# Altium schematic symbol library jlcpcb_2025_04_capacitors_extended_1206.schlib: 2503 symbols (part 10 of 14) (continued)
## GCJ31BR73A102KXJ1L
designator C?  Capacitance: 1nF  (hidden comment: *)
Capacitor, Ceramic (MLCC), 1nF, ±10%, 1kV, X7R, ±10%, SMD 1206; Manufacturer: Murata Electronics; Manufacturer Part Number: GCJ31BR73A102KXJ1L; Package Size: 1206; JLCPCB Basic Part: No; JLCPCB Part Number: C440144; Supplier 1: LCSC; Category: Capacitors - MLCC; Supplier Part Number 1: C440144; Tolerance: ±10%; Voltage Rating: 1kV; Temperature Coefficient: X7R; RoHS: Yes; ComponentLink1Description: Datasheet; ComponentLink1URL: https://wmsc.lcsc.com/wmsc/upload/file/pdf/v2/lcsc/2304140030_Murata-Electronics-GCJ31BR73A102KXJ1L_C440144.pdf; ComponentLink2Description: JLCPCB Part URL; ComponentLink2URL: https://jlcpcb.com/partdetail/C440144; ComponentLink3Description: LCSC Part URL; ComponentLink3URL: https://lcsc.com/product-detail/Multilayer-Ceramic-Capacitors-MLCC---SMD-SMT_Murata-Electronics-Murata-Electronics-GCJ31BR73A102KXJ1L_C440144.html
footprint CAP-1206 (1206 (3216M) Capacitor)
pins: 1, 2

## GCJ31BR73A332KXJ1L
designator C?  Capacitance: 3.3nF  (hidden comment: *)
Capacitor, Ceramic (MLCC), 3.3nF, ±10%, 1kV, X7R, ±10%, SMD 1206; Manufacturer: Murata Electronics; Manufacturer Part Number: GCJ31BR73A332KXJ1L; Package Size: 1206; JLCPCB Basic Part: No; JLCPCB Part Number: C2261389; Supplier 1: LCSC; Category: Capacitors - MLCC; Supplier Part Number 1: C2261389; Tolerance: ±10%; Voltage Rating: 1kV; Temperature Coefficient: X7R; RoHS: Yes; ComponentLink1Description: Datasheet; ComponentLink1URL: https://wmsc.lcsc.com/wmsc/upload/file/pdf/v2/lcsc/2308111556_Murata-Electronics-GCJ31BR73A332KXJ1L_C2261389.pdf; ComponentLink2Description: JLCPCB Part URL; ComponentLink2URL: https://jlcpcb.com/partdetail/C2261389; ComponentLink3Description: LCSC Part URL; ComponentLink3URL: https://lcsc.com/product-detail/Multilayer-Ceramic-Capacitors-MLCC---SMD-SMT_Murata-Electronics-Murata-Electronics-GCJ31BR73A332KXJ1L_C2261389.html
footprint CAP-1206 (1206 (3216M) Capacitor)
pins: 1, 2

## GCJ31BR73A472KXJ1L
designator C?  Capacitance: 4.7nF  (hidden comment: *)
Capacitor, Ceramic (MLCC), 4.7nF, ±10%, 1kV, X7R, ±10%, SMD 1206; Manufacturer: Murata Electronics; Manufacturer Part Number: GCJ31BR73A472KXJ1L; Package Size: 1206; JLCPCB Basic Part: No; JLCPCB Part Number: C437427; Supplier 1: LCSC; Category: Capacitors - MLCC; Supplier Part Number 1: C437427; Tolerance: ±10%; Voltage Rating: 1kV; Temperature Coefficient: X7R; RoHS: Yes; ComponentLink1Description: Datasheet; ComponentLink1URL: https://wmsc.lcsc.com/wmsc/upload/file/pdf/v2/lcsc/2304140030_Murata-Electronics-GCJ31BR73A472KXJ1L_C437427.pdf; ComponentLink2Description: JLCPCB Part URL; ComponentLink2URL: https://jlcpcb.com/partdetail/C437427; ComponentLink3Description: LCSC Part URL; ComponentLink3URL: https://lcsc.com/product-detail/Multilayer-Ceramic-Capacitors-MLCC---SMD-SMT_Murata-Electronics-Murata-Electronics-GCJ31BR73A472KXJ1L_C437427.html
footprint CAP-1206 (1206 (3216M) Capacitor)
pins: 1, 2

## GCJ31CC71E106KA15L
designator C?  Capacitance: 10uF  (hidden comment: *)
Capacitor, Ceramic (MLCC), 10uF, ±10%, 25V, X7S, ±10%, SMD 1206; Manufacturer: Murata Electronics; Manufacturer Part Number: GCJ31CC71E106KA15L; Package Size: 1206; JLCPCB Basic Part: No; JLCPCB Part Number: C710629; Supplier 1: LCSC; Category: Capacitors - MLCC; Supplier Part Number 1: C710629; Tolerance: ±10%; Voltage Rating: 25V; Temperature Coefficient: X7S; RoHS: Yes; ComponentLink1Description: Datasheet; ComponentLink1URL: https://wmsc.lcsc.com/wmsc/upload/file/pdf/v2/lcsc/2206281745_Murata-Electronics-GCJ31CC71E106KA15L_C710629.pdf; ComponentLink2Description: JLCPCB Part URL; ComponentLink2URL: https://jlcpcb.com/partdetail/C710629; ComponentLink3Description: LCSC Part URL; ComponentLink3URL: https://lcsc.com/product-detail/Multilayer-Ceramic-Capacitors-MLCC---SMD-SMT_Murata-Electronics-Murata-Electronics-GCJ31CC71E106KA15L_C710629.html
footprint CAP-1206 (1206 (3216M) Capacitor)
pins: 1, 2

## GCJ31CC71H475KA01L
designator C?  Capacitance: 4.7uF  (hidden comment: *)
Capacitor, Ceramic (MLCC), 4.7uF, ±10%, 50V, X7S, ±10%, SMD 1206; Manufacturer: Murata Electronics; Manufacturer Part Number: GCJ31CC71H475KA01L; Package Size: 1206; JLCPCB Basic Part: No; JLCPCB Part Number: C354363; Supplier 1: LCSC; Category: Capacitors - MLCC; Supplier Part Number 1: C354363; Tolerance: ±10%; Voltage Rating: 50V; Temperature Coefficient: X7S; RoHS: Yes; ComponentLink1Description: Datasheet; ComponentLink1URL: https://wmsc.lcsc.com/wmsc/upload/file/pdf/v2/lcsc/1912111437_Murata-Electronics-GCJ31CC71H475KA01L_C354363.pdf; ComponentLink2Description: JLCPCB Part URL; ComponentLink2URL: https://jlcpcb.com/partdetail/C354363; ComponentLink3Description: LCSC Part URL; ComponentLink3URL: https://lcsc.com/product-detail/Multilayer-Ceramic-Capacitors-MLCC---SMD-SMT_Murata-Electronics-Murata-Electronics-GCJ31CC71H475KA01L_C354363.html
footprint CAP-1206 (1206 (3216M) Capacitor)
pins: 1, 2

## GCJ31CC72A225KE01L
designator C?  Capacitance: 2.2uF  (hidden comment: *)
Capacitor, Ceramic (MLCC), 2.2uF, ±10%, 100V, ±10%, SMD 1206; Manufacturer: Murata Electronics; Manufacturer Part Number: GCJ31CC72A225KE01L; Package Size: 1206; JLCPCB Basic Part: No; JLCPCB Part Number: C782034; Supplier 1: LCSC; Category: Capacitors - MLCC; Supplier Part Number 1: C782034; Tolerance: ±10%; Voltage Rating: 100V; RoHS: Yes; ComponentLink1Description: Datasheet; ComponentLink1URL: https://wmsc.lcsc.com/wmsc/upload/file/pdf/v2/lcsc/2009121209_Murata-Electronics-GCJ31CC72A225KE01L_C782034.pdf; ComponentLink2Description: JLCPCB Part URL; ComponentLink2URL: https://jlcpcb.com/partdetail/C782034; ComponentLink3Description: LCSC Part URL; ComponentLink3URL: https://lcsc.com/product-detail/Multilayer-Ceramic-Capacitors-MLCC---SMD-SMT_Murata-Electronics-Murata-Electronics-GCJ31CC72A225KE01L_C782034.html
footprint CAP-1206 (1206 (3216M) Capacitor)
pins: 1, 2

## GCJ31CL8EL105KA07L
designator C?  Capacitance: 1uF  (hidden comment: *)
Capacitor, Ceramic (MLCC), 1uF, ±10%, 100V, ±10%, SMD 1206; Manufacturer: Murata Electronics; Manufacturer Part Number: GCJ31CL8EL105KA07L; Package Size: 1206; JLCPCB Basic Part: No; JLCPCB Part Number: C710631; Supplier 1: LCSC; Category: Capacitors - MLCC; Supplier Part Number 1: C710631; Tolerance: ±10%; Voltage Rating: 100V; RoHS: Yes; ComponentLink1Description: Datasheet; ComponentLink1URL: https://wmsc.lcsc.com/wmsc/upload/file/pdf/v2/lcsc/2101081033_Murata-Electronics-GCJ31CL8EL105KA07L_C710631.pdf; ComponentLink2Description: JLCPCB Part URL; ComponentLink2URL: https://jlcpcb.com/partdetail/C710631; ComponentLink3Description: LCSC Part URL; ComponentLink3URL: https://lcsc.com/product-detail/Multilayer-Ceramic-Capacitors-MLCC---SMD-SMT_Murata-Electronics-Murata-Electronics-GCJ31CL8EL105KA07L_C710631.html
footprint CAP-1206 (1206 (3216M) Capacitor)
pins: 1, 2

## GCJ31CR71C106KA15L
designator C?  Capacitance: 10uF  (hidden comment: *)
Capacitor, Ceramic (MLCC), 10uF, ±10%, 16V, ±10%, SMD 1206; Manufacturer: Murata Electronics; Manufacturer Part Number: GCJ31CR71C106KA15L; Package Size: 1206; JLCPCB Basic Part: No; JLCPCB Part Number: C710632; Supplier 1: LCSC; Category: Capacitors - MLCC; Supplier Part Number 1: C710632; Tolerance: ±10%; Voltage Rating: 16V; RoHS: Yes; ComponentLink1Description: Datasheet; ComponentLink1URL: https://wmsc.lcsc.com/wmsc/upload/file/pdf/v2/lcsc/2009141234_Murata-Electronics-GCJ31CR71C106KA15L_C710632.pdf; ComponentLink2Description: JLCPCB Part URL; ComponentLink2URL: https://jlcpcb.com/partdetail/C710632; ComponentLink3Description: LCSC Part URL; ComponentLink3URL: https://lcsc.com/product-detail/Multilayer-Ceramic-Capacitors-MLCC---SMD-SMT_Murata-Electronics-Murata-Electronics-GCJ31CR71C106KA15L_C710632.html
footprint CAP-1206 (1206 (3216M) Capacitor)
pins: 1, 2

## GCJ31CR71E475KA12L
designator C?  Capacitance: 4.7uF  (hidden comment: *)
Capacitor, Ceramic (MLCC), 4.7uF, ±10%, 25V, X7R, ±10%, SMD 1206; Manufacturer: Murata Electronics; Manufacturer Part Number: GCJ31CR71E475KA12L; Package Size: 1206; JLCPCB Basic Part: No; JLCPCB Part Number: C161121; Supplier 1: LCSC; Category: Capacitors - MLCC; Supplier Part Number 1: C161121; Tolerance: ±10%; Voltage Rating: 25V; Temperature Coefficient: X7R; RoHS: Yes; ComponentLink1Description: Datasheet; ComponentLink1URL: https://wmsc.lcsc.com/wmsc/upload/file/pdf/v2/lcsc/1912111437_Murata-Electronics-GCJ31CR71E475KA12L_C161121.pdf; ComponentLink2Description: JLCPCB Part URL; ComponentLink2URL: https://jlcpcb.com/partdetail/C161121; ComponentLink3Description: LCSC Part URL; ComponentLink3URL: https://lcsc.com/product-detail/Multilayer-Ceramic-Capacitors-MLCC---SMD-SMT_Murata-Electronics-Murata-Electronics-GCJ31CR71E475KA12L_C161121.html
footprint CAP-1206 (1206 (3216M) Capacitor)
pins: 1, 2

## GCJ31CR71H105KA12L
designator C?  Capacitance: 1uF  (hidden comment: *)
Capacitor, Ceramic (MLCC), 1uF, ±10%, 50V, X7R, ±10%, SMD 1206; Manufacturer: Murata Electronics; Manufacturer Part Number: GCJ31CR71H105KA12L; Package Size: 1206; JLCPCB Basic Part: No; JLCPCB Part Number: C161122; Supplier 1: LCSC; Category: Capacitors - MLCC; Supplier Part Number 1: C161122; Tolerance: ±10%; Voltage Rating: 50V; Temperature Coefficient: X7R; RoHS: Yes; ComponentLink1Description: Datasheet; ComponentLink1URL: https://wmsc.lcsc.com/wmsc/upload/file/pdf/v2/lcsc/1810201311_Murata-Electronics-GCJ31CR71H105KA12L_C161122.pdf; ComponentLink2Description: JLCPCB Part URL; ComponentLink2URL: https://jlcpcb.com/partdetail/C161122; ComponentLink3Description: LCSC Part URL; ComponentLink3URL: https://lcsc.com/product-detail/Multilayer-Ceramic-Capacitors-MLCC---SMD-SMT_Murata-Electronics-Murata-Electronics-GCJ31CR71H105KA12L_C161122.html
footprint CAP-1206 (1206 (3216M) Capacitor)
pins: 1, 2

## GCJ31CR71H225KA12K
designator C?  Capacitance: 2.2uF  (hidden comment: *)
Capacitor, Ceramic (MLCC), 2.2uF, ±10%, 50V, X7R, ±10%, SMD 1206; Manufacturer: Murata Electronics; Manufacturer Part Number: GCJ31CR71H225KA12K; Package Size: 1206; JLCPCB Basic Part: No; JLCPCB Part Number: C1864444; Supplier 1: LCSC; Category: Capacitors - MLCC; Supplier Part Number 1: C1864444; Tolerance: ±10%; Voltage Rating: 50V; Temperature Coefficient: X7R; RoHS: Yes; ComponentLink1Description: Datasheet; ComponentLink1URL: https://wmsc.lcsc.com/wmsc/upload/file/pdf/v2/lcsc/2201271800_Murata-Electronics-GCJ31CR71H225KA12K_C1864444.pdf; ComponentLink2Description: JLCPCB Part URL; ComponentLink2URL: https://jlcpcb.com/partdetail/C1864444; ComponentLink3Description: LCSC Part URL; ComponentLink3URL: https://lcsc.com/product-detail/Multilayer-Ceramic-Capacitors-MLCC---SMD-SMT_Murata-Electronics-Murata-Electronics-GCJ31CR71H225KA12K_C1864444.html
footprint CAP-1206 (1206 (3216M) Capacitor)
pins: 1, 2

## GCJ31CR71H225KA12L
designator C?  Capacitance: 2.2uF  (hidden comment: *)
Capacitor, Ceramic (MLCC), 2.2uF, ±10%, 50V, X7R, ±10%, SMD 1206; Manufacturer: Murata Electronics; Manufacturer Part Number: GCJ31CR71H225KA12L; Package Size: 1206; JLCPCB Basic Part: No; JLCPCB Part Number: C90787; Supplier 1: LCSC; Category: Capacitors - MLCC; Supplier Part Number 1: C90787; Tolerance: ±10%; Voltage Rating: 50V; Temperature Coefficient: X7R; RoHS: Yes; ComponentLink1Description: Datasheet; ComponentLink1URL: https://wmsc.lcsc.com/wmsc/upload/file/pdf/v2/lcsc/1810201312_Murata-Electronics-GCJ31CR71H225KA12L_C90787.pdf; ComponentLink2Description: JLCPCB Part URL; ComponentLink2URL: https://jlcpcb.com/partdetail/C90787; ComponentLink3Description: LCSC Part URL; ComponentLink3URL: https://lcsc.com/product-detail/Multilayer-Ceramic-Capacitors-MLCC---SMD-SMT_Murata-Electronics-Murata-Electronics-GCJ31CR71H225KA12L_C90787.html
footprint CAP-1206 (1206 (3216M) Capacitor)
pins: 1, 2

## GCJ31CR72A105KA01L
designator C?  Capacitance: 1uF  (hidden comment: *)
Capacitor, Ceramic (MLCC), 1uF, ±10%, 100V, X7R, ±10%, SMD 1206; Manufacturer: Murata Electronics; Manufacturer Part Number: GCJ31CR72A105KA01L; Package Size: 1206; JLCPCB Basic Part: No; JLCPCB Part Number: C354362; Supplier 1: LCSC; Category: Capacitors - MLCC; Supplier Part Number 1: C354362; Tolerance: ±10%; Voltage Rating: 100V; Temperature Coefficient: X7R; RoHS: Yes; ComponentLink1Description: Datasheet; ComponentLink1URL: https://wmsc.lcsc.com/wmsc/upload/file/pdf/v2/lcsc/1912111437_Murata-Electronics-GCJ31CR72A105KA01L_C354362.pdf; ComponentLink2Description: JLCPCB Part URL; ComponentLink2URL: https://jlcpcb.com/partdetail/C354362; ComponentLink3Description: LCSC Part URL; ComponentLink3URL: https://lcsc.com/product-detail/Multilayer-Ceramic-Capacitors-MLCC---SMD-SMT_Murata-Electronics-Murata-Electronics-GCJ31CR72A105KA01L_C354362.html
footprint CAP-1206 (1206 (3216M) Capacitor)
pins: 1, 2

## GCJ31CR72E104KXJ3L
designator C?  Capacitance: 100nF  (hidden comment: *)
Capacitor, Ceramic (MLCC), 100nF, ±10%, 250V, X7R, ±10%, SMD 1206; Manufacturer: Murata Electronics; Manufacturer Part Number: GCJ31CR72E104KXJ3L; Package Size: 1206; JLCPCB Basic Part: No; JLCPCB Part Number: C426652; Supplier 1: LCSC; Category: Capacitors - MLCC; Supplier Part Number 1: C426652; Tolerance: ±10%; Voltage Rating: 250V; Temperature Coefficient: X7R; RoHS: Yes; ComponentLink1Description: Datasheet; ComponentLink1URL: https://wmsc.lcsc.com/wmsc/upload/file/pdf/v2/lcsc/2304140030_Murata-Electronics-GCJ31CR72E104KXJ3L_C426652.pdf; ComponentLink2Description: JLCPCB Part URL; ComponentLink2URL: https://jlcpcb.com/partdetail/C426652; ComponentLink3Description: LCSC Part URL; ComponentLink3URL: https://lcsc.com/product-detail/Multilayer-Ceramic-Capacitors-MLCC---SMD-SMT_Murata-Electronics-Murata-Electronics-GCJ31CR72E104KXJ3L_C426652.html
footprint CAP-1206 (1206 (3216M) Capacitor)
pins: 1, 2

## GCJ31CR72J223KXJ3L
designator C?  Capacitance: 22nF  (hidden comment: *)
Capacitor, Ceramic (MLCC), 22nF, ±10%, 630V, X7R, ±10%, SMD 1206; Manufacturer: Murata Electronics; Manufacturer Part Number: GCJ31CR72J223KXJ3L; Package Size: 1206; JLCPCB Basic Part: No; JLCPCB Part Number: C437429; Supplier 1: LCSC; Category: Capacitors - MLCC; Supplier Part Number 1: C437429; Tolerance: ±10%; Voltage Rating: 630V; Temperature Coefficient: X7R; RoHS: Yes; ComponentLink1Description: Datasheet; ComponentLink1URL: https://wmsc.lcsc.com/wmsc/upload/file/pdf/v2/lcsc/2009141233_Murata-Electronics-GCJ31CR72J223KXJ3L_C437429.pdf; ComponentLink2Description: JLCPCB Part URL; ComponentLink2URL: https://jlcpcb.com/partdetail/C437429; ComponentLink3Description: LCSC Part URL; ComponentLink3URL: https://lcsc.com/product-detail/Multilayer-Ceramic-Capacitors-MLCC---SMD-SMT_Murata-Electronics-Murata-Electronics-GCJ31CR72J223KXJ3L_C437429.html
footprint CAP-1206 (1206 (3216M) Capacitor)
pins: 1, 2

## GCJ31CR73A103KXJ3L
designator C?  Capacitance: 10nF  (hidden comment: *)
Capacitor, Ceramic (MLCC), 10nF, ±10%, 1kV, X7R, ±10%, SMD 1206; Manufacturer: Murata Electronics; Manufacturer Part Number: GCJ31CR73A103KXJ3L; Package Size: 1206; JLCPCB Basic Part: No; JLCPCB Part Number: C524549; Supplier 1: LCSC; Category: Capacitors - MLCC; Supplier Part Number 1: C524549; Tolerance: ±10%; Voltage Rating: 1kV; Temperature Coefficient: X7R; RoHS: Yes; ComponentLink1Description: Datasheet; ComponentLink1URL: https://wmsc.lcsc.com/wmsc/upload/file/pdf/v2/lcsc/2005150732_Murata-Electronics-GCJ31CR73A103KXJ3L_C524549.pdf; ComponentLink2Description: JLCPCB Part URL; ComponentLink2URL: https://jlcpcb.com/partdetail/C524549; ComponentLink3Description: LCSC Part URL; ComponentLink3URL: https://lcsc.com/product-detail/Multilayer-Ceramic-Capacitors-MLCC---SMD-SMT_Murata-Electronics-Murata-Electronics-GCJ31CR73A103KXJ3L_C524549.html
footprint CAP-1206 (1206 (3216M) Capacitor)
pins: 1, 2

## GCJ31MR71E225KA12L
designator C?  Capacitance: 2.2uF  (hidden comment: *)
Capacitor, Ceramic (MLCC), 2.2uF, ±10%, 25V, X7R, ±10%, SMD 1206; Manufacturer: Murata Electronics; Manufacturer Part Number: GCJ31MR71E225KA12L; Package Size: 1206; JLCPCB Basic Part: No; JLCPCB Part Number: C782035; Supplier 1: LCSC; Category: Capacitors - MLCC; Supplier Part Number 1: C782035; Tolerance: ±10%; Voltage Rating: 25V; Temperature Coefficient: X7R; RoHS: Yes; ComponentLink1Description: Datasheet; ComponentLink1URL: https://wmsc.lcsc.com/wmsc/upload/file/pdf/v2/lcsc/2009121209_Murata-Electronics-GCJ31MR71E225KA12L_C782035.pdf; ComponentLink2Description: JLCPCB Part URL; ComponentLink2URL: https://jlcpcb.com/partdetail/C782035; ComponentLink3Description: LCSC Part URL; ComponentLink3URL: https://lcsc.com/product-detail/Multilayer-Ceramic-Capacitors-MLCC---SMD-SMT_Murata-Electronics-Murata-Electronics-GCJ31MR71E225KA12L_C782035.html
footprint CAP-1206 (1206 (3216M) Capacitor)
pins: 1, 2

## GCJ31MR71H105KA12L
designator C?  Capacitance: 1uF  (hidden comment: *)
Capacitor, Ceramic (MLCC), 1uF, ±10%, 50V, X7R, ±10%, SMD 1206; Manufacturer: Murata Electronics; Manufacturer Part Number: GCJ31MR71H105KA12L; Package Size: 1206; JLCPCB Basic Part: No; JLCPCB Part Number: C354361; Supplier 1: LCSC; Category: Capacitors - MLCC; Supplier Part Number 1: C354361; Tolerance: ±10%; Voltage Rating: 50V; Temperature Coefficient: X7R; RoHS: Yes; ComponentLink1Description: Datasheet; ComponentLink1URL: https://wmsc.lcsc.com/wmsc/upload/file/pdf/v2/lcsc/1912111437_Murata-Electronics-GCJ31MR71H105KA12L_C354361.pdf; ComponentLink2Description: JLCPCB Part URL; ComponentLink2URL: https://jlcpcb.com/partdetail/C354361; ComponentLink3Description: LCSC Part URL; ComponentLink3URL: https://lcsc.com/product-detail/Multilayer-Ceramic-Capacitors-MLCC---SMD-SMT_Murata-Electronics-Murata-Electronics-GCJ31MR71H105KA12L_C354361.html
footprint CAP-1206 (1206 (3216M) Capacitor)
pins: 1, 2

## GCJ31MR72A224KA01L
designator C?  Capacitance: 220nF  (hidden comment: *)
Capacitor, Ceramic (MLCC), 220nF, ±10%, 100V, X7R, ±10%, SMD 1206; Manufacturer: Murata Electronics; Manufacturer Part Number: GCJ31MR72A224KA01L; Package Size: 1206; JLCPCB Basic Part: No; JLCPCB Part Number: C363946; Supplier 1: LCSC; Category: Capacitors - MLCC; Supplier Part Number 1: C363946; Tolerance: ±10%; Voltage Rating: 100V; Temperature Coefficient: X7R; RoHS: Yes; ComponentLink1Description: Datasheet; ComponentLink1URL: https://wmsc.lcsc.com/wmsc/upload/file/pdf/v2/lcsc/2304140030_Murata-Electronics-GCJ31MR72A224KA01L_C363946.pdf; ComponentLink2Description: JLCPCB Part URL; ComponentLink2URL: https://jlcpcb.com/partdetail/C363946; ComponentLink3Description: LCSC Part URL; ComponentLink3URL: https://lcsc.com/product-detail/Multilayer-Ceramic-Capacitors-MLCC---SMD-SMT_Murata-Electronics-Murata-Electronics-GCJ31MR72A224KA01L_C363946.html
footprint CAP-1206 (1206 (3216M) Capacitor)
pins: 1, 2

## GCJ319R71H104KA01L
designator C?  Capacitance: 100nF  (hidden comment: *)
Capacitor, Ceramic (MLCC), 100nF, ±10%, 50V, X7R, ±10%, SMD 1206; Manufacturer: Murata Electronics; Manufacturer Part Number: GCJ319R71H104KA01L; Package Size: 1206; JLCPCB Basic Part: No; JLCPCB Part Number: C354364; Supplier 1: LCSC; Category: Capacitors - MLCC; Supplier Part Number 1: C354364; Tolerance: ±10%; Voltage Rating: 50V; Temperature Coefficient: X7R; RoHS: Yes; ComponentLink1Description: Datasheet; ComponentLink1URL: https://wmsc.lcsc.com/wmsc/upload/file/pdf/v2/lcsc/1912111437_Murata-Electronics-GCJ319R71H104KA01L_C354364.pdf; ComponentLink2Description: JLCPCB Part URL; ComponentLink2URL: https://jlcpcb.com/partdetail/C354364; ComponentLink3Description: LCSC Part URL; ComponentLink3URL: https://lcsc.com/product-detail/Multilayer-Ceramic-Capacitors-MLCC---SMD-SMT_Murata-Electronics-Murata-Electronics-GCJ319R71H104KA01L_C354364.html
footprint CAP-1206 (1206 (3216M) Capacitor)
pins: 1, 2

## GCJ319R72A104KA01L
designator C?  Capacitance: 100nF  (hidden comment: *)
Capacitor, Ceramic (MLCC), 100nF, ±10%, ±10%, SMD 1206; Manufacturer: Murata Electronics; Manufacturer Part Number: GCJ319R72A104KA01L; Package Size: 1206; JLCPCB Basic Part: No; JLCPCB Part Number: C527589; Supplier 1: LCSC; Category: Capacitors - MLCC; Supplier Part Number 1: C527589; Tolerance: ±10%; RoHS: Yes; ComponentLink1Description: Datasheet; ComponentLink1URL: https://wmsc.lcsc.com/wmsc/upload/file/pdf/v2/lcsc/2010141708_Murata-Electronics-GCJ319R72A104KA01L_C527589.pdf; ComponentLink2Description: JLCPCB Part URL; ComponentLink2URL: https://jlcpcb.com/partdetail/C527589; ComponentLink3Description: LCSC Part URL; ComponentLink3URL: https://lcsc.com/product-detail/Multilayer-Ceramic-Capacitors-MLCC---SMD-SMT_Murata-Electronics-Murata-Electronics-GCJ319R72A104KA01L_C527589.html
footprint CAP-1206 (1206 (3216M) Capacitor)
pins: 1, 2

## GCM31A5C2J151JX01D
designator C?  Capacitance: 150pF  (hidden comment: *)
Capacitor, Ceramic (MLCC), 150pF, ±5%, 630V, C0G, ±5%, SMD 1206; Manufacturer: Murata Electronics; Manufacturer Part Number: GCM31A5C2J151JX01D; Package Size: 1206; JLCPCB Basic Part: No; JLCPCB Part Number: C363947; Supplier 1: LCSC; Category: Capacitors - MLCC; Supplier Part Number 1: C363947; Tolerance: ±5%; Voltage Rating: 630V; Temperature Coefficient: C0G; RoHS: Yes; ComponentLink1Description: Datasheet; ComponentLink1URL: https://wmsc.lcsc.com/wmsc/upload/file/pdf/v2/lcsc/2304140030_Murata-Electronics-GCM31A5C2J151JX01D_C363947.pdf; ComponentLink2Description: JLCPCB Part URL; ComponentLink2URL: https://jlcpcb.com/partdetail/C363947; ComponentLink3Description: LCSC Part URL; ComponentLink3URL: https://lcsc.com/product-detail/Multilayer-Ceramic-Capacitors-MLCC---SMD-SMT_Murata-Electronics-Murata-Electronics-GCM31A5C2J151JX01D_C363947.html
footprint CAP-1206 (1206 (3216M) Capacitor)
pins: 1, 2

## GCM31A5C2J330JX01D
designator C?  Capacitance: 33pF  (hidden comment: *)
Capacitor, Ceramic (MLCC), 33pF, ±5%, 630V, C0G, ±5%, SMD 1206; Manufacturer: Murata Electronics; Manufacturer Part Number: GCM31A5C2J330JX01D; Package Size: 1206; JLCPCB Basic Part: No; JLCPCB Part Number: C2941952; Supplier 1: LCSC; Category: Capacitors - MLCC; Supplier Part Number 1: C2941952; Tolerance: ±5%; Voltage Rating: 630V; Temperature Coefficient: C0G; RoHS: Yes; ComponentLink1Description: Datasheet; ComponentLink1URL: https://wmsc.lcsc.com/wmsc/upload/file/pdf/v2/lcsc/2201121900_Murata-Electronics-GCM31A5C2J330JX01D_C2941952.pdf; ComponentLink2Description: JLCPCB Part URL; ComponentLink2URL: https://jlcpcb.com/partdetail/C2941952; ComponentLink3Description: LCSC Part URL; ComponentLink3URL: https://lcsc.com/product-detail/Multilayer-Ceramic-Capacitors-MLCC---SMD-SMT_Murata-Electronics-Murata-Electronics-GCM31A5C2J330JX01D_C2941952.html
footprint CAP-1206 (1206 (3216M) Capacitor)
pins: 1, 2

## GCM31A5C3A100JX01D
designator C?  Capacitance: 10pF  (hidden comment: *)
Capacitor, Ceramic (MLCC), 10pF, ±5%, 1kV, C0G, ±5%, SMD 1206; Manufacturer: Murata Electronics; Manufacturer Part Number: GCM31A5C3A100JX01D; Package Size: 1206; JLCPCB Basic Part: No; JLCPCB Part Number: C437499; Supplier 1: LCSC; Category: Capacitors - MLCC; Supplier Part Number 1: C437499; Tolerance: ±5%; Voltage Rating: 1kV; Temperature Coefficient: C0G; RoHS: Yes; ComponentLink1Description: Datasheet; ComponentLink1URL: https://wmsc.lcsc.com/wmsc/upload/file/pdf/v2/lcsc/2304140030_Murata-Electronics-GCM31A5C3A100JX01D_C437499.pdf; ComponentLink2Description: JLCPCB Part URL; ComponentLink2URL: https://jlcpcb.com/partdetail/C437499; ComponentLink3Description: LCSC Part URL; ComponentLink3URL: https://lcsc.com/product-detail/Multilayer-Ceramic-Capacitors-MLCC---SMD-SMT_Murata-Electronics-Murata-Electronics-GCM31A5C3A100JX01D_C437499.html
footprint CAP-1206 (1206 (3216M) Capacitor)
pins: 1, 2

## GCM31A5C3A101JX01D
designator C?  Capacitance: 100pF  (hidden comment: *)
Capacitor, Ceramic (MLCC), 100pF, ±5%, 1kV, C0G, ±5%, SMD 1206; Manufacturer: Murata Electronics; Manufacturer Part Number: GCM31A5C3A101JX01D; Package Size: 1206; JLCPCB Basic Part: No; JLCPCB Part Number: C363948; Supplier 1: LCSC; Category: Capacitors - MLCC; Supplier Part Number 1: C363948; Tolerance: ±5%; Voltage Rating: 1kV; Temperature Coefficient: C0G; RoHS: Yes; ComponentLink1Description: Datasheet; ComponentLink1URL: https://wmsc.lcsc.com/wmsc/upload/file/pdf/v2/lcsc/2304140030_Murata-Electronics-GCM31A5C3A101JX01D_C363948.pdf; ComponentLink2Description: JLCPCB Part URL; ComponentLink2URL: https://jlcpcb.com/partdetail/C363948; ComponentLink3Description: LCSC Part URL; ComponentLink3URL: https://lcsc.com/product-detail/Multilayer-Ceramic-Capacitors-MLCC---SMD-SMT_Murata-Electronics-Murata-Electronics-GCM31A5C3A101JX01D_C363948.html
footprint CAP-1206 (1206 (3216M) Capacitor)
pins: 1, 2

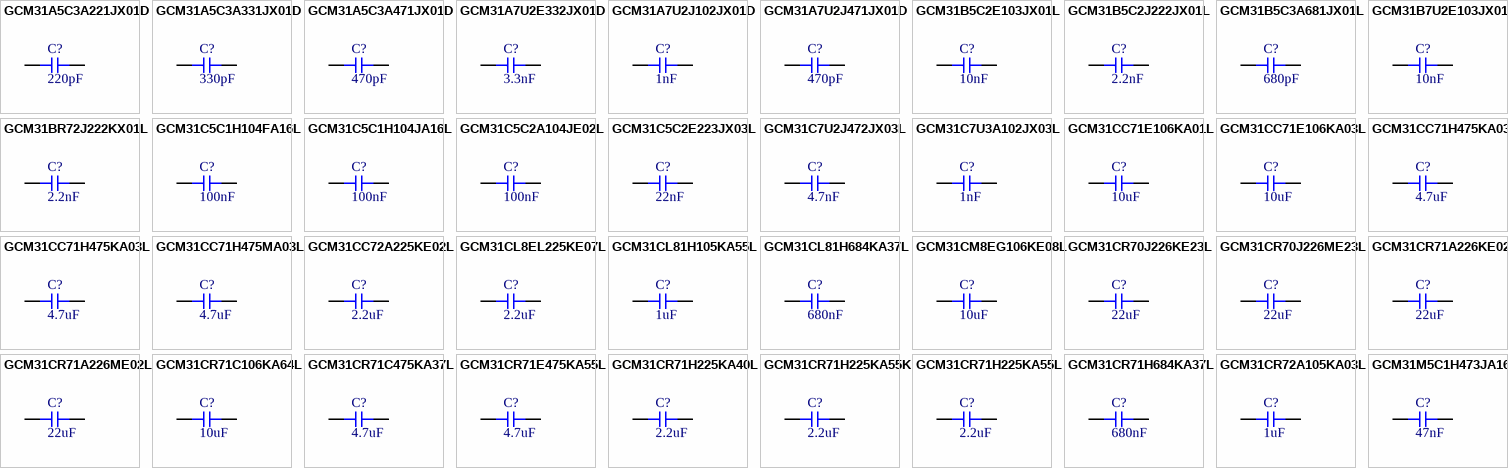
[diagram p44: symbols GCM31A5C3A221JX01D to GCM31M5C1H473JA16L]

## GCM31A5C3A221JX01D
designator C?  Capacitance: 220pF  (hidden comment: *)
Capacitor, Ceramic (MLCC), 220pF, ±5%, 1kV, ±5%, SMD 1206; Manufacturer: Murata Electronics; Manufacturer Part Number: GCM31A5C3A221JX01D; Package Size: 1206; JLCPCB Basic Part: No; JLCPCB Part Number: C909899; Supplier 1: LCSC; Category: Capacitors - MLCC; Supplier Part Number 1: C909899; Tolerance: ±5%; Voltage Rating: 1kV; RoHS: Yes; ComponentLink1Description: Datasheet; ComponentLink1URL: https://wmsc.lcsc.com/wmsc/upload/file/pdf/v2/lcsc/2201242100_Murata-Electronics-GCM31A5C3A221JX01D_C909899.pdf; ComponentLink2Description: JLCPCB Part URL; ComponentLink2URL: https://jlcpcb.com/partdetail/C909899; ComponentLink3Description: LCSC Part URL; ComponentLink3URL: https://lcsc.com/product-detail/Multilayer-Ceramic-Capacitors-MLCC---SMD-SMT_Murata-Electronics-Murata-Electronics-GCM31A5C3A221JX01D_C909899.html
footprint CAP-1206 (1206 (3216M) Capacitor)
pins: 1, 2

## GCM31A5C3A331JX01D
designator C?  Capacitance: 330pF  (hidden comment: *)
Capacitor, Ceramic (MLCC), 330pF, ±5%, 1kV, ±5%, SMD 1206; Manufacturer: Murata Electronics; Manufacturer Part Number: GCM31A5C3A331JX01D; Package Size: 1206; JLCPCB Basic Part: No; JLCPCB Part Number: C909898; Supplier 1: LCSC; Category: Capacitors - MLCC; Supplier Part Number 1: C909898; Tolerance: ±5%; Voltage Rating: 1kV; RoHS: Yes; ComponentLink1Description: Datasheet; ComponentLink1URL: https://wmsc.lcsc.com/wmsc/upload/file/pdf/v2/lcsc/2304140030_Murata-Electronics-GCM31A5C3A331JX01D_C909898.pdf; ComponentLink2Description: JLCPCB Part URL; ComponentLink2URL: https://jlcpcb.com/partdetail/C909898; ComponentLink3Description: LCSC Part URL; ComponentLink3URL: https://lcsc.com/product-detail/Multilayer-Ceramic-Capacitors-MLCC---SMD-SMT_Murata-Electronics-Murata-Electronics-GCM31A5C3A331JX01D_C909898.html
footprint CAP-1206 (1206 (3216M) Capacitor)
pins: 1, 2

## GCM31A5C3A471JX01D
designator C?  Capacitance: 470pF  (hidden comment: *)
Capacitor, Ceramic (MLCC), 470pF, ±5%, 1kV, ±5%, SMD 1206; Manufacturer: Murata Electronics; Manufacturer Part Number: GCM31A5C3A471JX01D; Package Size: 1206; JLCPCB Basic Part: No; JLCPCB Part Number: C909896; Supplier 1: LCSC; Category: Capacitors - MLCC; Supplier Part Number 1: C909896; Tolerance: ±5%; Voltage Rating: 1kV; RoHS: Yes; ComponentLink1Description: Datasheet; ComponentLink1URL: https://wmsc.lcsc.com/wmsc/upload/file/pdf/v2/lcsc/2304140030_Murata-Electronics-GCM31A5C3A471JX01D_C909896.pdf; ComponentLink2Description: JLCPCB Part URL; ComponentLink2URL: https://jlcpcb.com/partdetail/C909896; ComponentLink3Description: LCSC Part URL; ComponentLink3URL: https://lcsc.com/product-detail/Multilayer-Ceramic-Capacitors-MLCC---SMD-SMT_Murata-Electronics-Murata-Electronics-GCM31A5C3A471JX01D_C909896.html
footprint CAP-1206 (1206 (3216M) Capacitor)
pins: 1, 2

## GCM31A7U2E332JX01D
designator C?  Capacitance: 3.3nF  (hidden comment: *)
Capacitor, Ceramic (MLCC), 3.3nF, ±5%, 250V, U2J, ±5%, SMD 1206; Manufacturer: Murata Electronics; Manufacturer Part Number: GCM31A7U2E332JX01D; Package Size: 1206; JLCPCB Basic Part: No; JLCPCB Part Number: C909809; Supplier 1: LCSC; Category: Capacitors - MLCC; Supplier Part Number 1: C909809; Tolerance: ±5%; Voltage Rating: 250V; Temperature Coefficient: U2J; RoHS: Yes; ComponentLink1Description: Datasheet; ComponentLink1URL: https://wmsc.lcsc.com/wmsc/upload/file/pdf/v2/lcsc/2304140030_Murata-Electronics-GCM31A7U2E332JX01D_C909809.pdf; ComponentLink2Description: JLCPCB Part URL; ComponentLink2URL: https://jlcpcb.com/partdetail/C909809; ComponentLink3Description: LCSC Part URL; ComponentLink3URL: https://lcsc.com/product-detail/Multilayer-Ceramic-Capacitors-MLCC---SMD-SMT_Murata-Electronics-Murata-Electronics-GCM31A7U2E332JX01D_C909809.html
footprint CAP-1206 (1206 (3216M) Capacitor)
pins: 1, 2

## GCM31A7U2J102JX01D
designator C?  Capacitance: 1nF  (hidden comment: *)
Capacitor, Ceramic (MLCC), 1nF, ±5%, 630V, U2J, ±5%, SMD 1206; Manufacturer: Murata Electronics; Manufacturer Part Number: GCM31A7U2J102JX01D; Package Size: 1206; JLCPCB Basic Part: No; JLCPCB Part Number: C437500; Supplier 1: LCSC; Category: Capacitors - MLCC; Supplier Part Number 1: C437500; Tolerance: ±5%; Voltage Rating: 630V; Temperature Coefficient: U2J; RoHS: Yes; ComponentLink1Description: Datasheet; ComponentLink1URL: https://wmsc.lcsc.com/wmsc/upload/file/pdf/v2/lcsc/2304140030_Murata-Electronics-GCM31A7U2J102JX01D_C437500.pdf; ComponentLink2Description: JLCPCB Part URL; ComponentLink2URL: https://jlcpcb.com/partdetail/C437500; ComponentLink3Description: LCSC Part URL; ComponentLink3URL: https://lcsc.com/product-detail/Multilayer-Ceramic-Capacitors-MLCC---SMD-SMT_Murata-Electronics-Murata-Electronics-GCM31A7U2J102JX01D_C437500.html
footprint CAP-1206 (1206 (3216M) Capacitor)
pins: 1, 2

## GCM31A7U2J471JX01D
designator C?  Capacitance: 470pF  (hidden comment: *)
Capacitor, Ceramic (MLCC), 470pF, ±5%, 630V, U2J, ±5%, SMD 1206; Manufacturer: Murata Electronics; Manufacturer Part Number: GCM31A7U2J471JX01D; Package Size: 1206; JLCPCB Basic Part: No; JLCPCB Part Number: C393029; Supplier 1: LCSC; Category: Capacitors - MLCC; Supplier Part Number 1: C393029; Tolerance: ±5%; Voltage Rating: 630V; Temperature Coefficient: U2J; RoHS: Yes; ComponentLink1Description: Datasheet; ComponentLink1URL: https://wmsc.lcsc.com/wmsc/upload/file/pdf/v2/lcsc/2308111610_Murata-Electronics-GCM31A7U2J471JX01D_C393029.pdf; ComponentLink2Description: JLCPCB Part URL; ComponentLink2URL: https://jlcpcb.com/partdetail/C393029; ComponentLink3Description: LCSC Part URL; ComponentLink3URL: https://lcsc.com/product-detail/Multilayer-Ceramic-Capacitors-MLCC---SMD-SMT_Murata-Electronics-Murata-Electronics-GCM31A7U2J471JX01D_C393029.html
footprint CAP-1206 (1206 (3216M) Capacitor)
pins: 1, 2

## GCM31B5C2E103JX01L
designator C?  Capacitance: 10nF  (hidden comment: *)
Capacitor, Ceramic (MLCC), 10nF, ±5%, 250V, ±5%, SMD 1206; Manufacturer: Murata Electronics; Manufacturer Part Number: GCM31B5C2E103JX01L; Package Size: 1206; JLCPCB Basic Part: No; JLCPCB Part Number: C1021645; Supplier 1: LCSC; Category: Capacitors - MLCC; Supplier Part Number 1: C1021645; Tolerance: ±5%; Voltage Rating: 250V; RoHS: Yes; ComponentLink1Description: Datasheet; ComponentLink1URL: https://wmsc.lcsc.com/wmsc/upload/file/pdf/v2/lcsc/2304140030_Murata-Electronics-GCM31B5C2E103JX01L_C1021645.pdf; ComponentLink2Description: JLCPCB Part URL; ComponentLink2URL: https://jlcpcb.com/partdetail/C1021645; ComponentLink3Description: LCSC Part URL; ComponentLink3URL: https://lcsc.com/product-detail/Multilayer-Ceramic-Capacitors-MLCC---SMD-SMT_Murata-Electronics-Murata-Electronics-GCM31B5C2E103JX01L_C1021645.html
footprint CAP-1206 (1206 (3216M) Capacitor)
pins: 1, 2

## GCM31B5C2J222JX01L
designator C?  Capacitance: 2.2nF  (hidden comment: *)
Capacitor, Ceramic (MLCC), 2.2nF, ±5%, 630V, ±5%, SMD 1206; Manufacturer: Murata Electronics; Manufacturer Part Number: GCM31B5C2J222JX01L; Package Size: 1206; JLCPCB Basic Part: No; JLCPCB Part Number: C524557; Supplier 1: LCSC; Category: Capacitors - MLCC; Supplier Part Number 1: C524557; Tolerance: ±5%; Voltage Rating: 630V; RoHS: Yes; ComponentLink1Description: Datasheet; ComponentLink1URL: https://wmsc.lcsc.com/wmsc/upload/file/pdf/v2/lcsc/2304140030_Murata-Electronics-GCM31B5C2J222JX01L_C524557.pdf; ComponentLink2Description: JLCPCB Part URL; ComponentLink2URL: https://jlcpcb.com/partdetail/C524557; ComponentLink3Description: LCSC Part URL; ComponentLink3URL: https://lcsc.com/product-detail/Multilayer-Ceramic-Capacitors-MLCC---SMD-SMT_Murata-Electronics-Murata-Electronics-GCM31B5C2J222JX01L_C524557.html
footprint CAP-1206 (1206 (3216M) Capacitor)
pins: 1, 2

## GCM31B5C3A681JX01L
designator C?  Capacitance: 680pF  (hidden comment: *)
Capacitor, Ceramic (MLCC), 680pF, ±5%, 1kV, ±5%, SMD 1206; Manufacturer: Murata Electronics; Manufacturer Part Number: GCM31B5C3A681JX01L; Package Size: 1206; JLCPCB Basic Part: No; JLCPCB Part Number: C909894; Supplier 1: LCSC; Category: Capacitors - MLCC; Supplier Part Number 1: C909894; Tolerance: ±5%; Voltage Rating: 1kV; RoHS: Yes; ComponentLink1Description: Datasheet; ComponentLink1URL: https://wmsc.lcsc.com/wmsc/upload/file/pdf/v2/lcsc/2304140030_Murata-Electronics-GCM31B5C3A681JX01L_C909894.pdf; ComponentLink2Description: JLCPCB Part URL; ComponentLink2URL: https://jlcpcb.com/partdetail/C909894; ComponentLink3Description: LCSC Part URL; ComponentLink3URL: https://lcsc.com/product-detail/Multilayer-Ceramic-Capacitors-MLCC---SMD-SMT_Murata-Electronics-Murata-Electronics-GCM31B5C3A681JX01L_C909894.html
footprint CAP-1206 (1206 (3216M) Capacitor)
pins: 1, 2

## GCM31B7U2E103JX01L
designator C?  Capacitance: 10nF  (hidden comment: *)
Capacitor, Ceramic (MLCC), 10nF, ±5%, 250V, U2J, ±5%, SMD 1206; Manufacturer: Murata Electronics; Manufacturer Part Number: GCM31B7U2E103JX01L; Package Size: 1206; JLCPCB Basic Part: No; JLCPCB Part Number: C363962; Supplier 1: LCSC; Category: Capacitors - MLCC; Supplier Part Number 1: C363962; Tolerance: ±5%; Voltage Rating: 250V; Temperature Coefficient: U2J; RoHS: Yes; ComponentLink1Description: Datasheet; ComponentLink1URL: https://wmsc.lcsc.com/wmsc/upload/file/pdf/v2/lcsc/1912111437_Murata-Electronics-GCM31B7U2E103JX01L_C363962.pdf; ComponentLink2Description: JLCPCB Part URL; ComponentLink2URL: https://jlcpcb.com/partdetail/C363962; ComponentLink3Description: LCSC Part URL; ComponentLink3URL: https://lcsc.com/product-detail/Multilayer-Ceramic-Capacitors-MLCC---SMD-SMT_Murata-Electronics-Murata-Electronics-GCM31B7U2E103JX01L_C363962.html
footprint CAP-1206 (1206 (3216M) Capacitor)
pins: 1, 2

## GCM31BR72J222KX01L
designator C?  Capacitance: 2.2nF  (hidden comment: *)
Capacitor, Ceramic (MLCC), 2.2nF, ±10%, ±10%, SMD 1206; Manufacturer: Murata Electronics; Manufacturer Part Number: GCM31BR72J222KX01L; Package Size: 1206; JLCPCB Basic Part: No; JLCPCB Part Number: C913499; Supplier 1: LCSC; Category: Capacitors - MLCC; Supplier Part Number 1: C913499; Tolerance: ±10%; RoHS: Yes; ComponentLink1Description: Datasheet; ComponentLink1URL: https://wmsc.lcsc.com/wmsc/upload/file/pdf/v2/lcsc/2304140030_Murata-Electronics-GCM31BR72J222KX01L_C913499.pdf; ComponentLink2Description: JLCPCB Part URL; ComponentLink2URL: https://jlcpcb.com/partdetail/C913499; ComponentLink3Description: LCSC Part URL; ComponentLink3URL: https://lcsc.com/product-detail/Multilayer-Ceramic-Capacitors-MLCC---SMD-SMT_Murata-Electronics-Murata-Electronics-GCM31BR72J222KX01L_C913499.html
footprint CAP-1206 (1206 (3216M) Capacitor)
pins: 1, 2

## GCM31C5C1H104FA16L
designator C?  Capacitance: 100nF  (hidden comment: *)
Capacitor, Ceramic (MLCC), 100nF, ±1%, 50V, C0G, ±1%, SMD 1206; Manufacturer: Murata Electronics; Manufacturer Part Number: GCM31C5C1H104FA16L; Package Size: 1206; JLCPCB Basic Part: No; JLCPCB Part Number: C1864297; Supplier 1: LCSC; Category: Capacitors - MLCC; Supplier Part Number 1: C1864297; Tolerance: ±1%; Voltage Rating: 50V; Temperature Coefficient: C0G; RoHS: Yes; ComponentLink1Description: Datasheet; ComponentLink2Description: JLCPCB Part URL; ComponentLink2URL: https://jlcpcb.com/partdetail/C1864297; ComponentLink3Description: LCSC Part URL; ComponentLink3URL: https://lcsc.com/product-detail/Multilayer-Ceramic-Capacitors-MLCC---SMD-SMT_Murata-Electronics-Murata-Electronics-GCM31C5C1H104FA16L_C1864297.html
footprint CAP-1206 (1206 (3216M) Capacitor)
pins: 1, 2

## GCM31C5C1H104JA16L
designator C?  Capacitance: 100nF  (hidden comment: *)
Capacitor, Ceramic (MLCC), 100nF, ±5%, ±5%, SMD 1206; Manufacturer: Murata Electronics; Manufacturer Part Number: GCM31C5C1H104JA16L; Package Size: 1206; JLCPCB Basic Part: No; JLCPCB Part Number: C882571; Supplier 1: LCSC; Category: Capacitors - MLCC; Supplier Part Number 1: C882571; Tolerance: ±5%; RoHS: Yes; ComponentLink1Description: Datasheet; ComponentLink1URL: https://wmsc.lcsc.com/wmsc/upload/file/pdf/v2/lcsc/2201242130_Murata-Electronics-GCM31C5C1H104JA16L_C882571.pdf; ComponentLink2Description: JLCPCB Part URL; ComponentLink2URL: https://jlcpcb.com/partdetail/C882571; ComponentLink3Description: LCSC Part URL; ComponentLink3URL: https://lcsc.com/product-detail/Multilayer-Ceramic-Capacitors-MLCC---SMD-SMT_Murata-Electronics-Murata-Electronics-GCM31C5C1H104JA16L_C882571.html
footprint CAP-1206 (1206 (3216M) Capacitor)
pins: 1, 2

## GCM31C5C2A104JE02L
designator C?  Capacitance: 100nF  (hidden comment: *)
Capacitor, Ceramic (MLCC), 100nF, ±5%, 100V, C0G, ±5%, SMD 1206; Manufacturer: Murata Electronics; Manufacturer Part Number: GCM31C5C2A104JE02L; Package Size: 1206; JLCPCB Basic Part: No; JLCPCB Part Number: C2891592; Supplier 1: LCSC; Category: Capacitors - MLCC; Supplier Part Number 1: C2891592; Tolerance: ±5%; Voltage Rating: 100V; Temperature Coefficient: C0G; RoHS: Yes; ComponentLink1Description: Datasheet; ComponentLink1URL: https://wmsc.lcsc.com/wmsc/upload/file/pdf/v2/lcsc/2208251730_Murata-Electronics-GCM31C5C2A104JE02L_C2891592.pdf; ComponentLink2Description: JLCPCB Part URL; ComponentLink2URL: https://jlcpcb.com/partdetail/C2891592; ComponentLink3Description: LCSC Part URL; ComponentLink3URL: https://lcsc.com/product-detail/Multilayer-Ceramic-Capacitors-MLCC---SMD-SMT_Murata-Electronics-Murata-Electronics-GCM31C5C2A104JE02L_C2891592.html
footprint CAP-1206 (1206 (3216M) Capacitor)
pins: 1, 2

## GCM31C5C2E223JX03L
designator C?  Capacitance: 22nF  (hidden comment: *)
Capacitor, Ceramic (MLCC), 22nF, ±5%, 250V, C0G, ±5%, SMD 1206; Manufacturer: Murata Electronics; Manufacturer Part Number: GCM31C5C2E223JX03L; Package Size: 1206; JLCPCB Basic Part: No; JLCPCB Part Number: C3862155; Supplier 1: LCSC; Category: Capacitors - MLCC; Supplier Part Number 1: C3862155; Tolerance: ±5%; Voltage Rating: 250V; Temperature Coefficient: C0G; RoHS: Yes; ComponentLink1Description: Datasheet; ComponentLink1URL: https://wmsc.lcsc.com/wmsc/upload/file/pdf/v2/lcsc/2308111433_Murata-Electronics-GCM31C5C2E223JX03L_C3862155.pdf; ComponentLink2Description: JLCPCB Part URL; ComponentLink2URL: https://jlcpcb.com/partdetail/C3862155; ComponentLink3Description: LCSC Part URL; ComponentLink3URL: https://lcsc.com/product-detail/Multilayer-Ceramic-Capacitors-MLCC---SMD-SMT_Murata-Electronics-Murata-Electronics-GCM31C5C2E223JX03L_C3862155.html
footprint CAP-1206 (1206 (3216M) Capacitor)
pins: 1, 2

## GCM31C7U2J472JX03L
designator C?  Capacitance: 4.7nF  (hidden comment: *)
Capacitor, Ceramic (MLCC), 4.7nF, ±5%, 630V, U2J, ±5%, SMD 1206; Manufacturer: Murata Electronics; Manufacturer Part Number: GCM31C7U2J472JX03L; Package Size: 1206; JLCPCB Basic Part: No; JLCPCB Part Number: C464412; Supplier 1: LCSC; Category: Capacitors - MLCC; Supplier Part Number 1: C464412; Tolerance: ±5%; Voltage Rating: 630V; Temperature Coefficient: U2J; RoHS: Yes; ComponentLink1Description: Datasheet; ComponentLink1URL: https://wmsc.lcsc.com/wmsc/upload/file/pdf/v2/lcsc/2304140030_Murata-Electronics-GCM31C7U2J472JX03L_C464412.pdf; ComponentLink2Description: JLCPCB Part URL; ComponentLink2URL: https://jlcpcb.com/partdetail/C464412; ComponentLink3Description: LCSC Part URL; ComponentLink3URL: https://lcsc.com/product-detail/Multilayer-Ceramic-Capacitors-MLCC---SMD-SMT_Murata-Electronics-Murata-Electronics-GCM31C7U2J472JX03L_C464412.html
footprint CAP-1206 (1206 (3216M) Capacitor)
pins: 1, 2

## GCM31C7U3A102JX03L
designator C?  Capacitance: 1nF  (hidden comment: *)
Capacitor, Ceramic (MLCC), 1nF, ±5%, 1kV, U2J, ±5%, SMD 1206; Manufacturer: Murata Electronics; Manufacturer Part Number: GCM31C7U3A102JX03L; Package Size: 1206; JLCPCB Basic Part: No; JLCPCB Part Number: C161272; Supplier 1: LCSC; Category: Capacitors - MLCC; Supplier Part Number 1: C161272; Tolerance: ±5%; Voltage Rating: 1kV; Temperature Coefficient: U2J; RoHS: Yes; ComponentLink1Description: Datasheet; ComponentLink1URL: https://wmsc.lcsc.com/wmsc/upload/file/pdf/v2/lcsc/1810201316_Murata-Electronics-GCM31C7U3A102JX03L_C161272.pdf; ComponentLink2Description: JLCPCB Part URL; ComponentLink2URL: https://jlcpcb.com/partdetail/C161272; ComponentLink3Description: LCSC Part URL; ComponentLink3URL: https://lcsc.com/product-detail/Multilayer-Ceramic-Capacitors-MLCC---SMD-SMT_Murata-Electronics-Murata-Electronics-GCM31C7U3A102JX03L_C161272.html
footprint CAP-1206 (1206 (3216M) Capacitor)
pins: 1, 2

## GCM31CC71E106KA01L
designator C?  Capacitance: 10uF  (hidden comment: *)
Capacitor, Ceramic (MLCC), 10uF, ±10%, 25V, X7S, ±10%, SMD 1206; Manufacturer: Murata Electronics; Manufacturer Part Number: GCM31CC71E106KA01L; Package Size: 1206; JLCPCB Basic Part: No; JLCPCB Part Number: C126593; Supplier 1: LCSC; Category: Capacitors - MLCC; Supplier Part Number 1: C126593; Tolerance: ±10%; Voltage Rating: 25V; Temperature Coefficient: X7S; RoHS: Yes; ComponentLink1Description: Datasheet; ComponentLink1URL: https://wmsc.lcsc.com/wmsc/upload/file/pdf/v2/lcsc/2304140030_Murata-Electronics-GCM31CC71E106KA01L_C126593.pdf; ComponentLink2Description: JLCPCB Part URL; ComponentLink2URL: https://jlcpcb.com/partdetail/C126593; ComponentLink3Description: LCSC Part URL; ComponentLink3URL: https://lcsc.com/product-detail/Multilayer-Ceramic-Capacitors-MLCC---SMD-SMT_Murata-Electronics-Murata-Electronics-GCM31CC71E106KA01L_C126593.html
footprint CAP-1206 (1206 (3216M) Capacitor)
pins: 1, 2

## GCM31CC71E106KA03L
designator C?  Capacitance: 10uF  (hidden comment: *)
Capacitor, Ceramic (MLCC), 10uF, ±10%, 25V, X7S, ±10%, SMD 1206; Manufacturer: Murata Electronics; Manufacturer Part Number: GCM31CC71E106KA03L; Package Size: 1206; JLCPCB Basic Part: No; JLCPCB Part Number: C126594; Supplier 1: LCSC; Category: Capacitors - MLCC; Supplier Part Number 1: C126594; Tolerance: ±10%; Voltage Rating: 25V; Temperature Coefficient: X7S; RoHS: Yes; ComponentLink1Description: Datasheet; ComponentLink1URL: https://wmsc.lcsc.com/wmsc/upload/file/pdf/v2/lcsc/1912111437_Murata-Electronics-GCM31CC71E106KA03L_C126594.pdf; ComponentLink2Description: JLCPCB Part URL; ComponentLink2URL: https://jlcpcb.com/partdetail/C126594; ComponentLink3Description: LCSC Part URL; ComponentLink3URL: https://lcsc.com/product-detail/Multilayer-Ceramic-Capacitors-MLCC---SMD-SMT_Murata-Electronics-Murata-Electronics-GCM31CC71E106KA03L_C126594.html
footprint CAP-1206 (1206 (3216M) Capacitor)
pins: 1, 2

## GCM31CC71H475KA03K
designator C?  Capacitance: 4.7uF  (hidden comment: *)
Capacitor, Ceramic (MLCC), 4.7uF, ±10%, 50V, ±10%, SMD 1206; Manufacturer: Murata Electronics; Manufacturer Part Number: GCM31CC71H475KA03K; Package Size: 1206; JLCPCB Basic Part: No; JLCPCB Part Number: C2181619; Supplier 1: LCSC; Category: Capacitors - MLCC; Supplier Part Number 1: C2181619; Tolerance: ±10%; Voltage Rating: 50V; RoHS: Yes; ComponentLink1Description: Datasheet; ComponentLink1URL: https://wmsc.lcsc.com/wmsc/upload/file/pdf/v2/lcsc/2202041200_Murata-Electronics-GCM31CC71H475KA03K_C2181619.pdf; ComponentLink2Description: JLCPCB Part URL; ComponentLink2URL: https://jlcpcb.com/partdetail/C2181619; ComponentLink3Description: LCSC Part URL; ComponentLink3URL: https://lcsc.com/product-detail/Multilayer-Ceramic-Capacitors-MLCC---SMD-SMT_Murata-Electronics-Murata-Electronics-GCM31CC71H475KA03K_C2181619.html
footprint CAP-1206 (1206 (3216M) Capacitor)
pins: 1, 2

## GCM31CC71H475KA03L
designator C?  Capacitance: 4.7uF  (hidden comment: *)
Capacitor, Ceramic (MLCC), 4.7uF, ±10%, 50V, X7S, ±10%, SMD 1206; Manufacturer: Murata Electronics; Manufacturer Part Number: GCM31CC71H475KA03L; Package Size: 1206; JLCPCB Basic Part: No; JLCPCB Part Number: C126595; Supplier 1: LCSC; Category: Capacitors - MLCC; Supplier Part Number 1: C126595; Tolerance: ±10%; Voltage Rating: 50V; Temperature Coefficient: X7S; RoHS: Yes; ComponentLink1Description: Datasheet; ComponentLink1URL: https://wmsc.lcsc.com/wmsc/upload/file/pdf/v2/lcsc/1810201307_Murata-Electronics-GCM31CC71H475KA03L_C126595.pdf; ComponentLink2Description: JLCPCB Part URL; ComponentLink2URL: https://jlcpcb.com/partdetail/C126595; ComponentLink3Description: LCSC Part URL; ComponentLink3URL: https://lcsc.com/product-detail/Multilayer-Ceramic-Capacitors-MLCC---SMD-SMT_Murata-Electronics-Murata-Electronics-GCM31CC71H475KA03L_C126595.html
footprint CAP-1206 (1206 (3216M) Capacitor)
pins: 1, 2

## GCM31CC71H475MA03L
designator C?  Capacitance: 4.7uF  (hidden comment: *)
Capacitor, Ceramic (MLCC), 4.7uF, ±20%, 50V, X7S, ±20%, SMD 1206; Manufacturer: Murata Electronics; Manufacturer Part Number: GCM31CC71H475MA03L; Package Size: 1206; JLCPCB Basic Part: No; JLCPCB Part Number: C2270308; Supplier 1: LCSC; Category: Capacitors - MLCC; Supplier Part Number 1: C2270308; Tolerance: ±20%; Voltage Rating: 50V; Temperature Coefficient: X7S; RoHS: Yes; ComponentLink1Description: Datasheet; ComponentLink1URL: https://wmsc.lcsc.com/wmsc/upload/file/pdf/v2/lcsc/2104190106_Murata-Electronics-GCM31CC71H475MA03L_C2270308.pdf; ComponentLink2Description: JLCPCB Part URL; ComponentLink2URL: https://jlcpcb.com/partdetail/C2270308; ComponentLink3Description: LCSC Part URL; ComponentLink3URL: https://lcsc.com/product-detail/Multilayer-Ceramic-Capacitors-MLCC---SMD-SMT_Murata-Electronics-Murata-Electronics-GCM31CC71H475MA03L_C2270308.html
footprint CAP-1206 (1206 (3216M) Capacitor)
pins: 1, 2
